# Altium footprint library STC12C5A60S2底板.PcbLib: 26 footprints (part 2 of 2)
Each footprint in its own frame and in the unit in brackets; x right, y up, seen from the top. Pads: shape width x height; smd on the part's side, far side on the other; paste and mask are expansions set on the pad; w line width, h text height; cw(c..) or ccw(c..) is an arc to the next point about the centre after c.
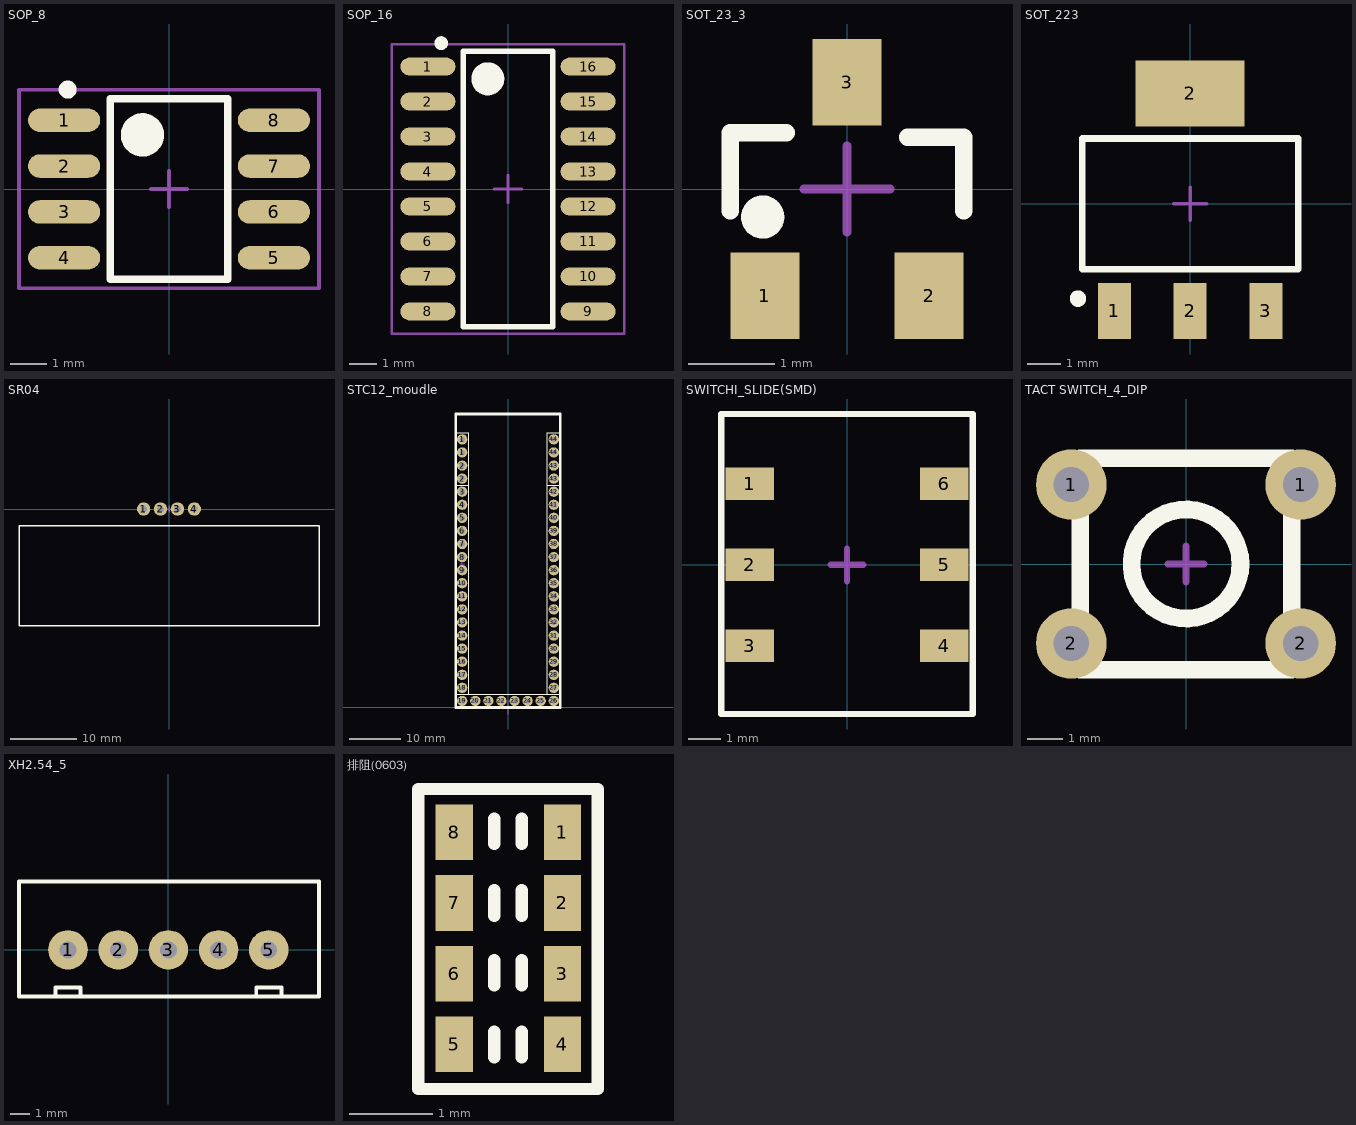
[diagram p1: the footprints below, top view; thin cyan lines are the x and y axes]

## SOP_8 [mm]
pads (8):
  oval 2x0.65 smd: 1(-2.906,1.905) 2(-2.906,0.635) 3(-2.906,-0.635) 4(-2.906,-1.905) 5(2.906,-1.905) 6(2.906,-0.635) 7(2.906,0.635) 8(2.906,1.905)
Top Overlay:
  circle w0.25: c-2.806,2.755 r0.125
  circle w0.6: c-0.735,1.5 r0.3
  lines w0.2: -1.626,-2.5 1.626,-2.5 1.626,2.5 -1.626,2.5 -1.626,-2.5
Mechanical 15:
  lines w0.1: -0.5,0 0.5,0 ; 0,-0.5 0,0.5 ; -4.156,-2.75 -4.156,2.75 4.156,2.75 4.156,-2.75 -4.156,-2.75
3D body: height 1.8, standoff 0, extent -2.999,-2.5 2.999,2.5

## SOP_16 [mm]
height 1.75
pads (16):
  oval 2x0.65 smd: 1(-2.906,4.445) 2(-2.906,3.175) 3(-2.906,1.905) 4(-2.906,0.635) 5(-2.906,-0.635) 6(-2.906,-1.905) 7(-2.906,-3.175) 8(-2.906,-4.445) 9(2.906,-4.445) 10(2.906,-3.175) 11(2.906,-1.905) 12(2.906,-0.635) 13(2.906,0.635) 14(2.906,1.905) 15(2.906,3.175) 16(2.906,4.445)
Top Overlay:
  circle w0.25: c-2.425,5.295 r0.125
  circle w0.6: c-0.735,4 r0.3
  lines w0.2: -1.626,-5 -1.626,5 1.626,5 1.626,-5 -1.626,-5
Mechanical 15:
  lines w0.1: -0.5,0 0.5,0 ; 0,-0.5 0,0.5 ; -4.216,-5.25 -4.216,5.25 4.216,5.25 4.216,-5.25 -4.216,-5.25
3D body: height 1.48, standoff -0.01, extent -3.055,-5 3.056,5

## SOT_23_3 [mm]
height 1.2
pads (3):
  rect 0.8x1 smd: 1(-0.95,-1.235) 2(0.95,-1.235) 3(0,1.235)
Top Overlay:
  circle w0.25: c-0.975,-0.325 r0.125
  lines w0.2: -1.35,-0.254 -1.35,0.65 -0.7,0.65 ; 0.7,0.6 1.35,0.6 1.35,-0.254
Mechanical 15:
  lines w0.1: -0.5,0 0.5,0 ; 0,-0.5 0,0.5
3D body: height 1.02, standoff -0.01, extent -1.45,-1.189 1.45,1.19

## SOT_223 [mm]
height 1.8
pads (4):
  rect 1x1.7 smd: 1(-2.3,-3.25) 2(0,-3.25) 3(2.3,-3.25)
  rect 3.3x2 smd: 2(0,3.349)
Top Overlay:
  circle w0.25: c-3.401,-2.875 r0.125
  lines w0.2: -3.276,-1.981 -3.276,1.981 3.276,1.981 3.276,-1.981 -3.276,-1.981
Mechanical 15:
  lines w0.1: -0.5,0 0.5,0 ; 0,-0.5 0,0.5
3D body: height 1.93, standoff 0, extent -3.25,-3.507 3.25,3.508

## SR04 [mm]
pads (4):
  round 2 hole 1: 1(-3.81,0) 2(-1.27,0) 3(1.27,0) 4(3.81,0)
Top Overlay:
  lines w0.2: -22.5,-17.5 22.5,-17.5 22.5,-2.5 -22.5,-2.5 -22.5,-17.5
Mechanical 15:
  lines w0.2: -0.5,0 0.5,0 ; 0,-0.5 0,0.5
3D body: height 22.5, standoff -2.68, extent -22.75,-17.818 22.25,0.25

## STC12_moudle [mm]
pads (48):
  round 2 hole 1: 1(-8.89,49.53) 1(-8.89,52.07) 2(-8.89,44.45) 2(-8.89,46.99) 3(-8.89,41.91) 4(-8.89,39.37) 5(-8.89,36.83) 6(-8.89,34.29) 7(-8.89,31.75) 8(-8.89,29.21) 9(-8.89,26.67) 10(-8.89,24.13) 11(-8.89,21.59) 12(-8.89,19.05) 13(-8.89,16.51) 14(-8.89,13.97) 15(-8.89,11.43) 16(-8.89,8.89) 17(-8.89,6.35) 18(-8.89,3.81) 19(-8.89,1.27) 20(-6.35,1.27) 21(-3.81,1.27) 22(-1.27,1.27) 23(1.27,1.27) 24(3.81,1.27) 25(6.35,1.27) 26(8.89,1.27) 27(8.89,3.81) 28(8.89,6.35) 29(8.89,8.89) 30(8.89,11.43) 31(8.89,13.97) 32(8.89,16.51) 33(8.89,19.05) 34(8.89,21.59) 35(8.89,24.13) 36(8.89,26.67) 37(8.89,29.21) 38(8.89,31.75) 39(8.89,34.29) 40(8.89,36.83) 41(8.89,39.37) 42(8.89,41.91) 43(8.89,44.45) 43(8.89,46.99) 44(8.89,49.53) 44(8.89,52.07)
Top Overlay:
  lines w0.2: -10.16,43.18 -7.62,43.18 ; 7.62,43.18 10.16,43.18 ; 10.16,0 10.16,2.54 ; -7.62,2.54 7.62,2.54 ; -7.62,2.54 -7.62,53.34 -10.16,53.34 -10.16,2.54 -7.62,2.54 ; 7.62,2.54 7.62,53.34 10.16,53.34 10.16,2.54 ; 7.62,2.54 10.16,2.54
  lines w0.508: -10.16,0 -10.16,57 10.16,57 10.16,0 -10.16,0
Mechanical 15:
  lines w0.2: -9.398,27.94 -8.382,27.94 ; -8.89,27.432 -8.89,28.448 ; -1.27,0 1.27,0 ; 0,-1.27 0,1.27
3D body: height 8.5, standoff -3.2, extent -10.285,0.02 10.285,2.52
3D body: height 8.5, standoff -3.2, extent 7.64,2.415 10.14,53.465
3D body: height 8.5, standoff -3.2, extent -10.14,2.415 -7.64,53.465

## SWITCHI_SLIDE(SMD) [mm]
pads (6):
  rect 1.5x1 smd: 1(-3,2.5) 2(-3,0) 3(-3,-2.5) 4(3,-2.5) 5(3,0) 6(3,2.5)
Top Overlay:
  lines w0.2: -3.875,-4.6 3.875,-4.6 3.875,3.25 3.875,4.65 -3.875,4.65 -3.875,3.25 -3.875,-4.6
Mechanical 15:
  lines w0.2: -0.5,0 0.5,0 ; 0,-0.5 0,0.5
3D body: height 5.45, standoff 0, extent -3.45,-4.55 3.45,4.5

## TACT SWITCH_4_DIP [mm]
pads (4):
  round 2 hole 1: 1(-3.25,2.25) 1(3.25,2.25) 2(-3.25,-2.25) 2(3.25,-2.25)
Top Overlay:
  circle w0.5: c0,0 r1.545
  lines w0.5: -3,-3 3,-3 3,3 -3,3 -3,-3
Mechanical 15:
  lines w0.2: -0.508,0 0.508,0 ; 0,-0.508 0,0.508
3D body: height 5.51, standoff -3.57, extent -3.553,-3 3.554,3

## XH2.54_5 [mm]
pads (5):
  round 2 hole 0.85: 1(-5.08,0) 2(-2.54,0) 3(0,0) 4(2.54,0) 5(5.08,0)
Top Overlay:
  lines w0.2: -5.715,-2.35 -5.715,-1.905 -4.445,-1.905 -4.445,-2.35 ; 4.445,-2.35 4.445,-1.905 5.715,-1.905 5.715,-2.35 ; -7.56,-2.35 -7.56,3.45 7.62,3.45 7.62,-2.35 -7.56,-2.35
Mechanical 15:
  lines w0.2: -0.508,0 0.508,0 ; 0,-0.508 0,0.508

## 排阻(0603) [mm]
pads (8):
  rect 0.45x0.67 smd mask+0.05: 1(2.878,4.23) 2(2.878,3.38) 3(2.878,2.53) 4(2.878,1.68) 5(1.578,1.68) 6(1.578,2.53) 7(1.578,3.38) 8(1.578,4.23)
Top Overlay:
  lines w0.15: 2.057,1.524 2.057,1.829 ; 2.057,2.388 2.057,2.692 ; 2.057,3.226 2.057,3.531 ; 2.057,4.089 2.057,4.394 ; 2.388,1.524 2.388,1.829 ; 2.388,2.388 2.388,2.692 ; 2.388,3.226 2.388,3.531 ; 2.388,4.089 2.388,4.394 ; 1.143,1.143 3.302,1.143 3.302,4.75 1.143,4.75 1.143,1.143